# Altium footprint library DIP Component.PcbLib: 327 footprints (part 1 of 21)
Each footprint in its own frame and in the unit in brackets; x right, y up, seen from the top. Pads: shape width x height; smd on the part's side, far side on the other; paste and mask are expansions set on the pad; w line width, h text height; cw(c..) or ccw(c..) is an arc to the next point about the centre after c.
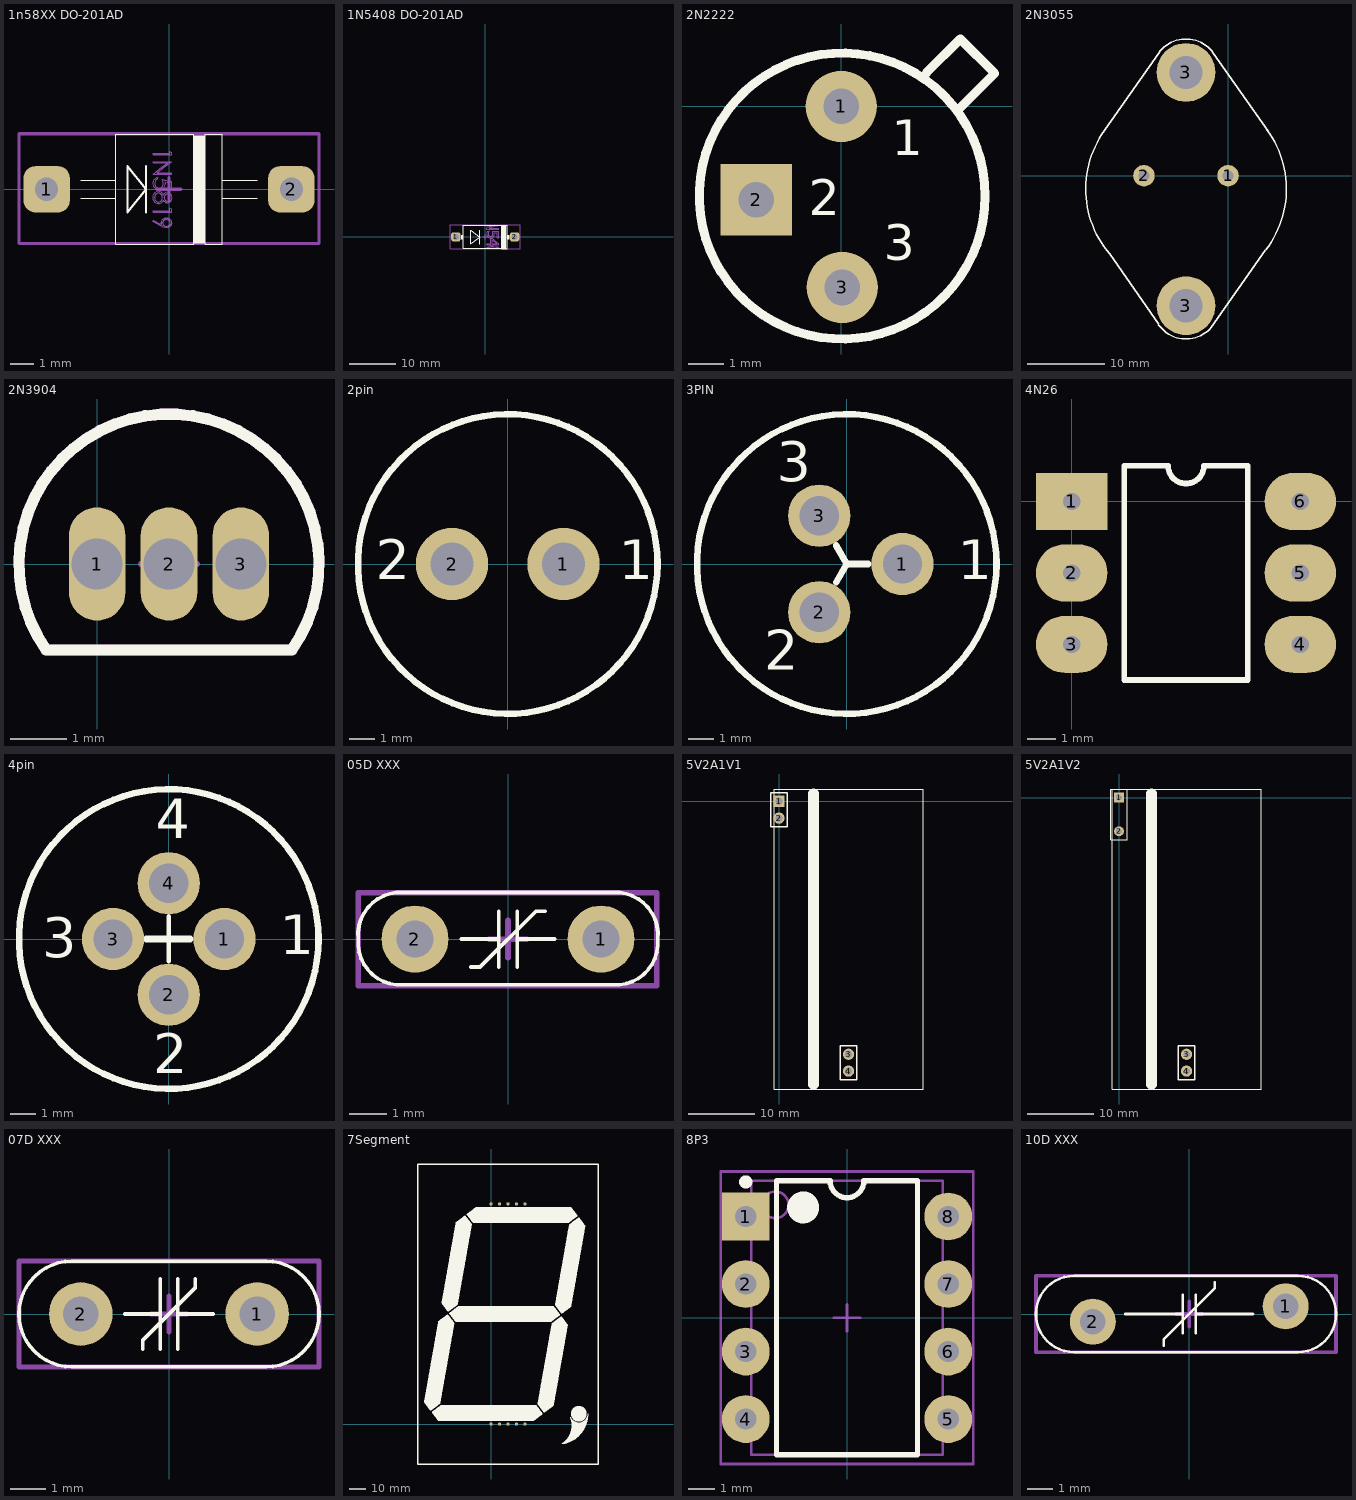
[diagram p0: the footprints below, top view; thin cyan lines are the x and y axes]

## 1n58XX DO-201AD [mm] "Designer Abbas Basereh"
height 5
pads (2):
  rrect50% 2x2 hole 1: 1(-5.3,0) 2(5.3,0)
Top Overlay:
  rectangle: 1.068,-2.31 1.568,2.31
  lines w0.013: -3.818,-0.393 -2.318,-0.393 ; -3.818,0.392 -2.318,0.392 ; 1.068,-2.31 1.568,-2.31 ; 1.068,2.31 1.568,2.31 ; 2.318,-0.393 3.818,-0.393 ; 2.318,0.392 3.818,0.392 ; -2.318,-2.375 1.068,-2.375 1.068,0 1.068,2.375 -2.318,2.375 -2.318,-2.375 ; 1.568,-2.375 2.318,-2.375 2.318,2.375 1.568,2.375 1.568,0 1.568,-2.375
  lines w0.1: -1,-1 -1,1 ; -1.8,-1 -1.8,1 -1,0 -1.8,-1
Mechanical 1:
  lines w0.013: -0.704,-0.352 ccw(c-0.457,-0.365) -0.617,-0.554 ; -0.704,0.26 cw(c-0.467,0.257) -0.48,0.494 ; -0.687,-1.371 -0.347,-1.548 ; -0.684,-0.967 0.11,-0.967 ; -0.684,0.644 -0.372,0.886 -0.061,1.117 -0.061,1.141 ; -0.684,1.177 0.093,1.177 ; -0.684,1.525 0.028,1.525 0.028,1.557 ; -0.511,0.002 -0.481,-0.006 -0.425,-0.011 ; -0.347,-1.442 -0.342,-1.489 -0.342,-1.521 ; -0.337,0.002 -0.371,-0.006 -0.425,-0.011 ; -0.287,0.415 0.11,0.337 ; -0.165,0.233 -0.18,0.324 -0.18,0.331 ; 0.028,1.613 0.11,1.58 ; 0.11,0.696 -0.515,0.696 -0.515,0.711 ; 0.128,-1.442 cw(c-0.081,-1.404) -0.114,-1.614 ; 0.13,-0.357 cw(c-0.081,-0.362) -0.076,-0.573 ; -0.623,-0.36 cw(c-0.449,-0.339) -0.462,-0.163 ; -0.623,-0.36 ccw(c-0.448,-0.379) -0.454,-0.555 ccw(c-0.467,-0.376) -0.287,-0.365 ; -0.623,-0.36 -0.623,-0.353 cw(c-0.451,-0.333) -0.462,-0.16 ; -0.623,0.261 ccw(c-0.425,0.258) -0.422,0.06 ; -0.623,0.261 cw(c-0.453,0.266) -0.48,0.434 -0.48,0.504 ccw(c-0.464,0.265) -0.704,0.265 ccw(c-0.435,0.258) -0.425,-0.011 ; -0.623,0.261 -0.623,0.256 ccw(c-0.427,0.255) -0.422,0.059 ; -0.617,-0.566 cw(c-0.45,-0.374) -0.704,-0.36 cw(c-0.455,-0.343) -0.459,-0.092 cw(c-0.47,-0.336) -0.242,-0.249 cw(c-0.066,-0.325) -0.074,-0.133 cw(c-0.087,-0.351) 0.13,-0.364 cw(c-0.082,-0.373) -0.076,-0.585 ; -0.617,-0.566 -0.541,-0.61 -0.453,-0.624 ; -0.617,-0.566 -0.617,-0.554 ; -0.617,-0.554 -0.54,-0.597 -0.453,-0.611 ; -0.515,0.711 0.11,0.711 0.11,0.642 -0.684,0.642 -0.684,0.658 -0.372,0.905 -0.061,1.141 ; -0.515,0.711 -0.203,0.956 0.11,1.19 0.11,1.203 -0.684,1.203 -0.684,1.141 -0.061,1.141 ; -0.462,-0.163 cw(c-0.472,-0.348) -0.287,-0.365 ; -0.462,-0.163 -0.462,-0.16 ; -0.462,-0.16 cw(c-0.47,-0.343) -0.287,-0.357 -0.287,-0.365 ; -0.453,-0.624 ccw(c-0.462,-0.388) -0.242,-0.475 ; -0.453,-0.624 -0.453,-0.611 ; -0.453,-0.611 ccw(c-0.46,-0.375) -0.242,-0.465 ; -0.425,-0.011 ccw(c-0.411,0.235) -0.165,0.238 -0.18,0.331 ; -0.425,-0.011 -0.425,-0.011 ; -0.422,0.059 ccw(c-0.419,0.232) -0.246,0.246 -0.246,0.251 ; -0.422,0.059 -0.422,0.06 ; -0.422,0.06 ccw(c-0.421,0.235) -0.246,0.251 ; -0.347,-1.582 ccw(c-0.086,-1.111) -0.114,-1.649 ; -0.347,-1.582 -0.704,-1.391 -0.665,-1.345 -0.342,-1.521 ; -0.347,-1.582 -0.347,-1.548 ; -0.347,-1.548 ccw(c-0.092,-1.09) -0.114,-1.614 ; -0.342,-1.521 -0.348,-1.456 cw(c-0.131,-1.474) -0.113,-1.256 cw(c-0.096,-1.483) 0.13,-1.463 cw(c-0.083,-1.437) -0.114,-1.649 ; -0.267,-1.466 cw(c-0.112,-1.471) -0.109,-1.316 ; -0.267,-1.466 ccw(c-0.127,-1.458) -0.109,-1.597 ccw(c-0.099,-1.449) 0.049,-1.46 ; -0.267,-1.466 -0.267,-1.435 cw(c-0.114,-1.442) -0.109,-1.288 ; -0.246,0.251 ccw(c-0.738,0.227) -0.287,0.424 0.11,0.344 0.11,0.02 0.028,0.02 0.028,0.289 -0.18,0.331 ; -0.242,-0.475 ccw(c-0.072,-0.399) -0.076,-0.585 ; -0.242,-0.475 -0.242,-0.465 ; -0.242,-0.465 ccw(c-0.073,-0.386) -0.076,-0.573 ; -0.206,-0.363 ccw(c-0.062,-0.372) -0.073,-0.516 ccw(c-0.086,-0.38) 0.049,-0.36 ; -0.206,-0.363 cw(c-0.055,-0.354) -0.075,-0.204 ; -0.206,-0.363 -0.206,-0.356 cw(c-0.057,-0.348) -0.075,-0.2 ; -0.114,-1.649 -0.114,-1.614 ; -0.109,-1.316 cw(c-0.104,-1.469) 0.049,-1.46 ; -0.109,-1.316 -0.109,-1.288 ; -0.109,-1.288 cw(c-0.103,-1.44) 0.049,-1.43 0.049,-1.46 ; -0.076,-0.585 -0.076,-0.573 ; -0.075,-0.204 cw(c-0.089,-0.343) 0.049,-0.36 ; -0.075,-0.204 -0.075,-0.2 ; -0.075,-0.2 cw(c-0.088,-0.336) 0.049,-0.353 0.049,-0.36 ; 0.028,1.557 0.028,1.648 0.11,1.614 0.11,1.503 -0.684,1.503 -0.684,1.557 0.028,1.557 ; -0.684,-0.988 -0.684,-0.922 0.028,-0.922 0.028,-0.809 0.11,-0.852 0.11,-0.988 -0.684,-0.988
Mechanical 15:
  lines w0.15: -0.5,0 0.5,0 ; 0,-0.5 0,0.5 ; -6.5,-2.35 6.5,-2.35 6.5,2.4 -6.5,2.4 -6.5,-2.35
3D body "User Library-1N5819.STEP": height 5.38, standoff -1.98, extent -5.72,-2.35 5.7,2.4

## 1N5408 DO-201AD [mm] "Designer Abbas Basereh"
height 5
pads (2):
  rrect50% 2x2 hole 1.3: 1(-6.35,0) 2(6.35,0)
Top Overlay:
  rectangle: -5.25,-0.6 -4.7,0.4
  rectangle: 4.8,-0.6 5.25,0.4
  rectangle: 3.55,-2.5 4.45,2.5
  lines w0.013: 3.6,-2.5 0.469,-2.5 -4.7,-2.5 -4.7,2.5 3.6,2.5 ; 3.6,-2.511 4.8,-2.511 4.8,2.511 3.6,2.511 3.6,-2.511
  lines w0.1: -1.15,-1.6 -1.15,1.4 ; -3.15,-1.5 -1.15,-0.1 -3.15,1.4 -3.15,-1.5
Mechanical 1:
  drawing of 280 lines, arcs and shapes, not listed
Mechanical 15:
  lines w0.15: -0.5,0 0.5,0 ; 0,-0.5 0,0.5 ; -7.6,-2.6 7.6,-2.6 7.6,2.6 -7.6,2.6 -7.6,-2.6
3D body "User Library-Diode 1N5408 (pcb).STEP": height 5.51, standoff -2.85, extent -6.95,-2.511 6.95,2.511

## 2N2222 [mm] "NPN Transistor"
pads (3):
  round 2 hole 1: 1(0,0) 3(0.025,-5.08)
  rect 2x2 hole 1: 2(-2.388,-2.616)
Top Overlay:
  circle w0.254: c0.026,-2.515 r4.012
  lines w0.254: 2.388,0.94 3.34,1.892 4.305,0.927 3.251,-0.127
  text "3" at 1.194,-4.318 h1
  text "2" at -0.914,-3.048 h1
  text "1" at 1.422,-1.372 h1
3D body "User Library-TO-18_2N2222.step": height 6.6, standoff -1.79, extent -2.794,-5.303 2.814,0.305

## 2N3055 [mil]
pads (4):
  round 110 hole 55: 1(0,0) 2(-429,0)
  round 300 hole 170: 3(-214.5,-663) 3(-214.5,527)
Top Overlay:
  lines w7: -643.63,211.53 -352.3,624.91 ; -643.35,211.35 ccw(c-214.5,-68) -604.76,-399.13 ; -604.26,-398.71 -353.99,-758.96 ; -354.97,-759.64 ccw(c-214.74,-662.22) -84.58,-772.72 190.44,-380.36 ; -353.49,625.76 cw(c-214.5,527) -75.51,625.76 ; -76.7,624.91 204,227.91 ; 192.43,-378.52 ccw(c-214.5,-68) 198.28,234.7
3D body "Heat Sink.STEP": height 1236.69, standoff 30, extent -1340.75,-1190.04 873.16,1039.41
3D body "2N3055.STEP": height 410.39, standoff -58.11, extent -730.25,-856.51 293.37,689.02

## 2N3904 [mm] "NPN Transistor Small Signal"
pads (3):
  oval 1x2 hole 0.9: 1(0,0) 2(1.27,0) 3(2.54,0)
Top Overlay:
  lines w0.2: -0.901,-1.52 cw(c1.27,0) 3.441,-1.52 -0.901,-1.52
Mechanical 13:
  lines w0.2: -0.901,-1.52 cw(c1.27,0) 3.441,-1.52 -0.901,-1.52
Mechanical 15:
  lines w0.1: 0.77,0 1.77,0 ; 1.27,-0.5 1.27,0.5
3D body "User Library-2N3904 Transistors NPN TO-92 3L (2,54mm).STEP": height 17.82, standoff -1.7, extent -1.11,-1.25 3.65,2.38

## 2pin [mil]
pads (2):
  round 110 hole 65: 1(85,0) 2(-85,0)
Top Overlay:
  circle w10: c0,0 r228.35
  text "1" at 169.11,-23.62 h60
  text "2" at -200.97,-23.62 h60
3D body "2PIN1.STEP": height 641.73, standoff -98.43, extent -297.24,-297.24 297.25,297.25

## 3PIN [mil]
pads (3):
  round 95 hole 60: 1(85,0) 2(-42,-73.49) 3(-42,73.49)
Top Overlay:
  circle w10: c0,0 r228.35
  lines w10: -16.25,28.43 0,0 ; -16,-28 0,0 ; 33,0 0,0
  text "1" at 169.11,-23.62 h60
  text "2" at -126.17,-161.42 h60
  text "3" at -106.48,125.98 h60
3D body "3pin1.STEP": height 653.54, standoff -86.61, extent -299.21,-299.21 295.28,295.28

## 4N26 [mm]
pads (6):
  rect 2.5x2 hole 0.6: 1(0,0)
  oval 2.5x2 hole 0.6: 2(0,-2.5) 3(0,-5) 4(8,-5) 5(8,-2.5) 6(8,0)
Top Overlay:
  lines w0.2: 1.835,-6.25 1.835,1.25 3.375,1.25 ccw(c4,1.25) 4.625,1.25 6.165,1.25 6.165,-6.25 1.835,-6.25

## 4pin [mil]
pads (4):
  round 95 hole 60: 1(85,0) 2(0,-85) 3(-85,0) 4(0,85)
Top Overlay:
  circle w10: c0,0 r228.35
  lines w7: 0,-34 0,35
  lines w10: -34,0 33,0
  text "1" at 169.11,-23.62 h60
  text "4" at -19.87,153.54 h60
  text "3" at -193.09,-27.56 h60
  text "2" at -23.8,-204.72 h60
3D body "4PIN1.STEP": height 641.73, standoff -98.43, extent -297.24,-297.24 297.25,297.25

## 05D XXX [mm] "MOV-05DxxxK Metal Oxide Varistors (MOVs) are 5 mm-Design:Abbas Basereh"
height 8
pads (2):
  round 1.8 hole 1: 1(2.5,0) 2(-2.5,0)
Top Overlay:
  lines w0.1: -1.25,0 -0.25,0 ; -1,-0.75 -0.75,-0.75 0.75,0.75 1,0.75 ; -0.25,-0.75 -0.25,0.75 ; 0.25,-0.75 0.25,0.75 ; 0.25,0 1.25,0 ; -4.025,0 cw(c-2.887,0.112) -3,1.25 3,1.25 cw(c2.887,0.112) 4.025,0 cw(c2.9,-0.1) 3,-1.225 -3,-1.225 cw(c-2.9,-0.1) -4.025,0
Mechanical 15:
  lines w0.15: -0.5,0 0.5,0 ; 0,-0.5 0,0.5 ; -4.025,-1.25 -4.025,1.25 4,1.25 4,-1.25 -4.025,-1.25
3D body "User Library-Warystor_5mm.STEP": height 11, standoff -1.57, extent -4.01,-1.26 3.99,1.25

## 5V2A1V1 [mm]
pads (4):
  rect 1.7x1.7 hole 1.1: 1(0,0)
  round 1.7 hole 1.1: 2(0,-2.54) 3(10.5,-38.2) 4(10.5,-40.74)
Top Overlay:
  lines w0.127: -0.7,-43.44 -0.7,1.86 20.2,1.86 21.8,1.86 21.8,-43.44 -0.7,-43.44
  lines w0.2: -1.27,-3.81 1.27,-3.81 1.27,1.27 -1.27,1.27 -1.27,-3.81 ; 9.23,-42.01 9.23,-36.93 11.77,-36.93 11.77,-42.01 9.23,-42.01
  lines w1.6: 5.2,-42.74 5.2,1.16

## 5V2A1V2 [mm]
pads (4):
  rect 1.5x1.5 hole 0.85: 1(0,0)
  round 1.5 hole 0.85: 2(0,-5.08)
  round 1.7 hole 1: 3(10.2,-38.76) 4(10.2,-41.3)
Top Overlay:
  lines w0.127: -1.27,-6.35 -1.27,1.27 1.27,1.27 1.27,-6.35 -1.27,-6.35 ; -1,-44 21.5,-44 21.5,1.3 19.9,1.3 -1,1.3 -1,-44
  lines w0.2: 8.93,-42.57 11.47,-42.57 11.47,-37.49 8.93,-37.49 8.93,-42.57
  lines w1.6: 4.9,-43.3 4.9,0.6

## 07D XXX [mm] "MOV-07DxxxK Metal Oxide Varistors (MOVs) are 7 mm-Design:Abbas Basereh"
height 11
pads (2):
  round 1.8 hole 1: 1(2.5,0) 2(-2.5,0)
Top Overlay:
  lines w0.1: -1.25,0 -0.25,0 ; -0.75,-1 -0.75,-0.75 0.75,0.75 0.75,1 ; -0.25,-1 -0.25,1 ; 0.25,-1 0.25,1 ; 0.25,0 1.25,0 ; -2.75,1.5 ccw(c-2.75,0) -4.25,0 ccw(c-2.75,0) -2.75,-1.5 2.75,-1.5 ; -2.75,1.5 -2.75,1.5 ; -2.75,1.5 2.75,1.5 cw(c2.75,0) 4.25,0 cw(c2.75,0) 2.75,-1.5 ; 2.75,-1.5 2.75,-1.5
Mechanical 15:
  lines w0.15: -0.5,0 0.5,0 ; 0,-0.5 0,0.5 ; -4.25,-1.5 -4.25,1.5 4.25,1.5 4.25,-1.5 -4.25,-1.5
3D body "User Library-Warystor_5mm.STEP": height 11, standoff -1.57, extent -4,-1.26 4,1.25

## 7Segment [mm]
pads (10):
  round 2 hole 0.85: 1(0,0) 2(5.08,0) 3(10.16,0) 4(15.24,0) 5(20.32,0) 6(20.32,132.004) 7(15.24,132.004) 8(10.16,132.004) 9(5.08,132.004) 10(0,132.004)
Top Overlay:
  drawing of 13 lines, arcs and shapes, not listed
3D body "7Segment.STEP": height 15.6, standoff -4.3, extent -43.85,-24 64.15,156

## 8P3 [mm] "DIP, 8-Leads, Row Spacing 7.62mm, Pitch 2.54mm, Body 9.59x6.61mm"
height 5.34
pads (8):
  rect 1.8x1.8 hole 0.8: 1(-3.81,3.81)
  round 1.8 hole 0.8: 2(-3.81,1.27) 3(-3.81,-1.27) 4(-3.81,-3.81) 5(3.81,-3.81) 6(3.81,-1.27) 7(3.81,1.27) 8(3.81,3.81)
Top Overlay:
  circle w0.6: c-1.65,4.15 r0.3
  circle w0.25: c-3.81,5.11 r0.125
  lines w0.2: -2.65,-5.15 2.65,-5.15 2.65,5.15 0.635,5.15 cw(c0,5.15) -0.635,5.15 -2.65,5.15 -2.65,-5.15
Mechanical 13:
  circle w0.1: c-2.7,4.25 r0.5
  lines w0.1: -3.6,-5.15 3.6,-5.15 3.6,5.15 -3.6,5.15 -3.6,-5.15
Mechanical 15:
  lines w0.1: -0.5,0 0.5,0 ; 0,-0.5 0,0.5 ; -4.75,-5.5 4.75,-5.5 4.75,5.5 -4.75,5.5 -4.75,-5.5
3D body "User Library-DIP8-300-metric.STEP": height 4.5, standoff -3.5, extent -3.88,-5.4 3.88,5.4

## 10D XXX [mm] "MOV-10DxxxK Metal Oxide Varistors (MOVs) are 10 mm-Design:Abbas Basereh"
height 14.5
pads (2):
  round 1.8 hole 1: 1(3.775,0.3) 2(-3.775,-0.3)
Top Overlay:
  lines w0.1: -2.5,0 -0.25,0 ; -1,-1.25 -1,-1 1,1 1,1.25 ; -0.25,-0.75 -0.25,0.75 ; 0.25,-0.75 0.25,0.75 ; 0.25,0 2.5,0 ; 4.25,-1.5 ccw(c4.25,0) 5.75,0 ccw(c4.25,0) 4.25,1.5 -4.5,1.5 ccw(c-4.5,0) -6,0 ccw(c-4.5,0) -4.5,-1.5 4.25,-1.5 ; 4.25,-1.5 4.25,-1.5
Mechanical 15:
  lines w0.15: -0.5,0 0.5,0 ; 0,-0.5 0,0.5 ; -6,-1.5 5.75,-1.5 5.75,1.5 -6,1.5 -6,-1.5
3D body "User Library-final MOV7,5.STEP": height 16.5, standoff -2, extent -5.776,-0.95 5.525,0.9